# Altium footprint library con-samtec.PCBLIB: 805 footprints (part 22 of 55)
Each footprint in its own frame and in the unit in brackets; x right, y up, seen from the top. Pads: shape width x height; smd on the part's side, far side on the other; paste and mask are expansions set on the pad; w line width, h text height; cw(c..) or ccw(c..) is an arc to the next point about the centre after c.
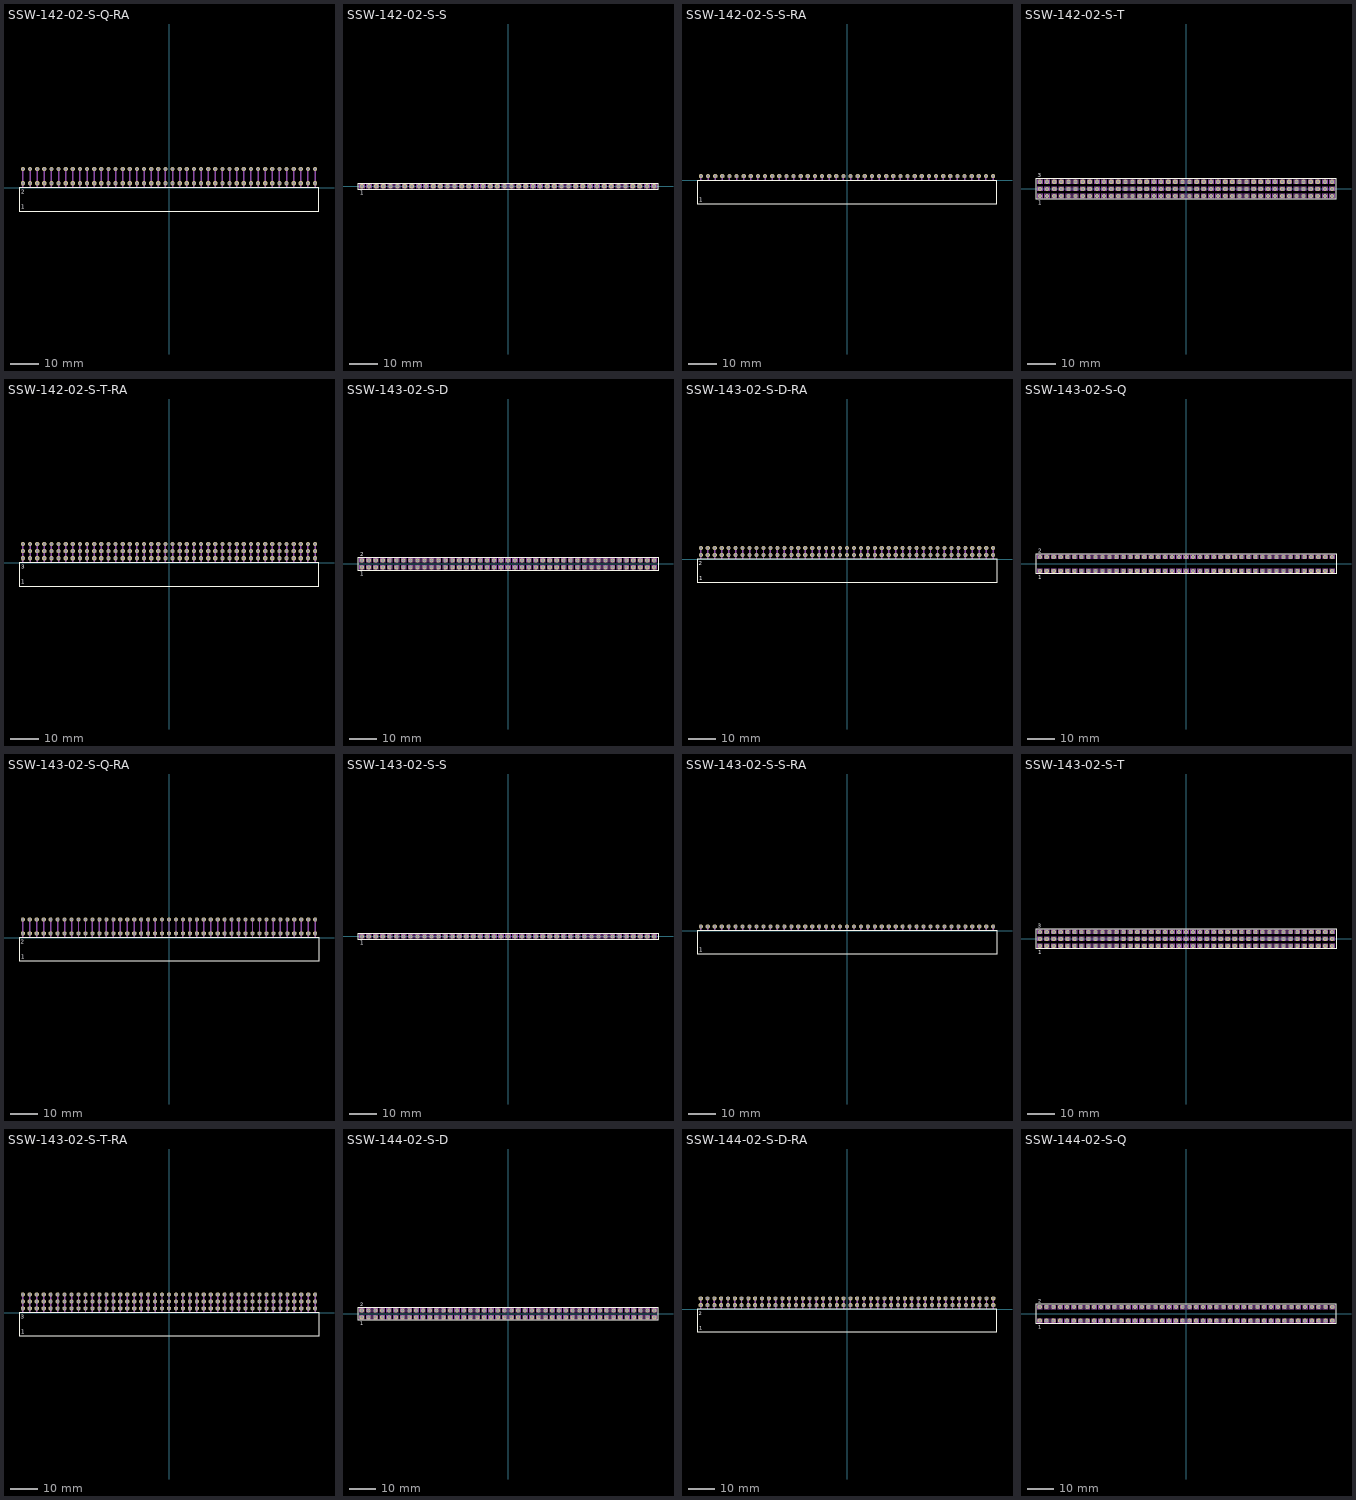
[diagram p21: the footprints below, top view; thin cyan lines are the x and y axes]

## SSW-142-02-S-Q-RA [mil]
pads (84):
  oct 59.06x59.06 hole 39.37: 1(-2050,60) 2(-2050,260) 3(-1950,60) 4(-1950,260) 5(-1850,60) 6(-1850,260) 7(-1750,60) 8(-1750,260) 9(-1650,60) 10(-1650,260) 11(-1550,60) 12(-1550,260) 13(-1450,60) 14(-1450,260) 15(-1350,60) 16(-1350,260) 17(-1250,60) 18(-1250,260) 19(-1150,60) 20(-1150,260) 21(-1050,60) 22(-1050,260) 23(-950,60) 24(-950,260) 25(-850,60) 26(-850,260) 27(-750,60) 28(-750,260) 29(-650,60) 30(-650,260) 31(-550,60) 32(-550,260) 33(-450,60) 34(-450,260) 35(-350,60) 36(-350,260) 37(-250,60) 38(-250,260) 39(-150,60) 40(-150,260) 41(-50,60) 42(-50,260) 43(50,60) 44(50,260) 45(150,60) 46(150,260) 47(250,60) 48(250,260) 49(350,60) 50(350,260) 51(450,60) 52(450,260) 53(550,60) 54(550,260) 55(650,60) 56(650,260) 57(750,60) 58(750,260) 59(850,60) 60(850,260) 61(950,60) 62(950,260) 63(1050,60) 64(1050,260) 65(1150,60) 66(1150,260) 67(1250,60) 68(1250,260) 69(1350,60) 70(1350,260) 71(1450,60) 72(1450,260) 73(1550,60) 74(1550,260) 75(1650,60) 76(1650,260) 77(1750,60) 78(1750,260) 79(1850,60) 80(1850,260) 81(1950,60) 82(1950,260) 83(2050,60) 84(2050,260)
Top Overlay:
  lines w8: -2105.08,-330.55 2105.08,-330.55 2105.08,-4.17 -2105.08,-4.17 -2105.08,-330.55
  text "1" at -2073.43,-301.18 h56.1
  text "2" at -2076.38,-86.61 h56.1
Mechanical 16:
  rectangle: -2060,0 -2040,270
  rectangle: -1960,0 -1940,270
  rectangle: -1860,0 -1840,270
  rectangle: -1760,0 -1740,270
  rectangle: -1660,0 -1640,270
  rectangle: -1560,0 -1540,270
  rectangle: -1460,0 -1440,270
  rectangle: -1360,0 -1340,270
  rectangle: -1260,0 -1240,270
  rectangle: -1160,0 -1140,270
  rectangle: -1060,0 -1040,270
  rectangle: -960,0 -940,270
  rectangle: -860,0 -840,270
  rectangle: -760,0 -740,270
  rectangle: -660,0 -640,270
  rectangle: -560,0 -540,270
  rectangle: -460,0 -440,270
  rectangle: -360,0 -340,270
  rectangle: -260,0 -240,270
  rectangle: -160,0 -140,270
  rectangle: -60,0 -40,270
  rectangle: 40,0 60,270
  rectangle: 140,0 160,270
  rectangle: 240,0 260,270
  rectangle: 340,0 360,270
  rectangle: 440,0 460,270
  rectangle: 540,0 560,270
  rectangle: 640,0 660,270
  rectangle: 740,0 760,270
  rectangle: 840,0 860,270
  rectangle: 940,0 960,270
  rectangle: 1040,0 1060,270
  rectangle: 1140,0 1160,270
  rectangle: 1240,0 1260,270
  rectangle: 1340,0 1360,270
  rectangle: 1440,0 1460,270
  rectangle: 1540,0 1560,270
  rectangle: 1640,0 1660,270
  rectangle: 1740,0 1760,270
  rectangle: 1840,0 1860,270
  rectangle: 1940,0 1960,270
  rectangle: 2040,0 2060,270

## SSW-142-02-S-S [mm]
pads (42):
  oct 1.5x1.5 hole 1: 1(-52.07,0) 2(-49.53,0) 3(-46.99,0) 4(-44.45,0) 5(-41.91,0) 6(-39.37,0) 7(-36.83,0) 8(-34.29,0) 9(-31.75,0) 10(-29.21,0) 11(-26.67,0) 12(-24.13,0) 13(-21.59,0) 14(-19.05,0) 15(-16.51,0) 16(-13.97,0) 17(-11.43,0) 18(-8.89,0) 19(-6.35,0) 20(-3.81,0) 21(-1.27,0) 22(1.27,0) 23(3.81,0) 24(6.35,0) 25(8.89,0) 26(11.43,0) 27(13.97,0) 28(16.51,0) 29(19.05,0) 30(21.59,0) 31(24.13,0) 32(26.67,0) 33(29.21,0) 34(31.75,0) 35(34.29,0) 36(36.83,0) 37(39.37,0) 38(41.91,0) 39(44.45,0) 40(46.99,0) 41(49.53,0) 42(52.07,0)
Top Overlay:
  lines w0.203: -53.469,-1.155 53.469,-1.155 53.469,1.155 -53.469,1.155 -53.469,-1.155
  text "1" at -52.578,-3.048 h1.42
Mechanical 16:
  drawing of 168 lines, arcs and shapes, not listed

## SSW-142-02-S-S-RA [mil]
pads (42):
  oct 59.06x59.06 hole 39.37: 1(-2050,60) 2(-1950,60) 3(-1850,60) 4(-1750,60) 5(-1650,60) 6(-1550,60) 7(-1450,60) 8(-1350,60) 9(-1250,60) 10(-1150,60) 11(-1050,60) 12(-950,60) 13(-850,60) 14(-750,60) 15(-650,60) 16(-550,60) 17(-450,60) 18(-350,60) 19(-250,60) 20(-150,60) 21(-50,60) 22(50,60) 23(150,60) 24(250,60) 25(350,60) 26(450,60) 27(550,60) 28(650,60) 29(750,60) 30(850,60) 31(950,60) 32(1050,60) 33(1150,60) 34(1250,60) 35(1350,60) 36(1450,60) 37(1550,60) 38(1650,60) 39(1750,60) 40(1850,60) 41(1950,60) 42(2050,60)
Top Overlay:
  lines w8: -2105.08,-330.55 2105.08,-330.55 2105.08,-4.17 -2105.08,-4.17 -2105.08,-330.55
  text "1" at -2073.43,-301.18 h56.1
Mechanical 16:
  rectangle: -2060,0 -2040,70
  rectangle: -1960,0 -1940,70
  rectangle: -1860,0 -1840,70
  rectangle: -1760,0 -1740,70
  rectangle: -1660,0 -1640,70
  rectangle: -1560,0 -1540,70
  rectangle: -1460,0 -1440,70
  rectangle: -1360,0 -1340,70
  rectangle: -1260,0 -1240,70
  rectangle: -1160,0 -1140,70
  rectangle: -1060,0 -1040,70
  rectangle: -960,0 -940,70
  rectangle: -860,0 -840,70
  rectangle: -760,0 -740,70
  rectangle: -660,0 -640,70
  rectangle: -560,0 -540,70
  rectangle: -460,0 -440,70
  rectangle: -360,0 -340,70
  rectangle: -260,0 -240,70
  rectangle: -160,0 -140,70
  rectangle: -60,0 -40,70
  rectangle: 40,0 60,70
  rectangle: 140,0 160,70
  rectangle: 240,0 260,70
  rectangle: 340,0 360,70
  rectangle: 440,0 460,70
  rectangle: 540,0 560,70
  rectangle: 640,0 660,70
  rectangle: 740,0 760,70
  rectangle: 840,0 860,70
  rectangle: 940,0 960,70
  rectangle: 1040,0 1060,70
  rectangle: 1140,0 1160,70
  rectangle: 1240,0 1260,70
  rectangle: 1340,0 1360,70
  rectangle: 1440,0 1460,70
  rectangle: 1540,0 1560,70
  rectangle: 1640,0 1660,70
  rectangle: 1740,0 1760,70
  rectangle: 1840,0 1860,70
  rectangle: 1940,0 1960,70
  rectangle: 2040,0 2060,70

## SSW-142-02-S-T [mm]
pads (126):
  oct 1.5x1.5 hole 1: 1(-52.07,-2.54) 2(-52.07,0) 3(-52.07,2.54) 4(-49.53,-2.54) 5(-49.53,0) 6(-49.53,2.54) 7(-46.99,-2.54) 8(-46.99,0) 9(-46.99,2.54) 10(-44.45,-2.54) 11(-44.45,0) 12(-44.45,2.54) 13(-41.91,-2.54) 14(-41.91,0) 15(-41.91,2.54) 16(-39.37,-2.54) 17(-39.37,0) 18(-39.37,2.54) 19(-36.83,-2.54) 20(-36.83,0) 21(-36.83,2.54) 22(-34.29,-2.54) 23(-34.29,0) 24(-34.29,2.54) 25(-31.75,-2.54) 26(-31.75,0) 27(-31.75,2.54) 28(-29.21,-2.54) 29(-29.21,0) 30(-29.21,2.54) 31(-26.67,-2.54) 32(-26.67,0) 33(-26.67,2.54) 34(-24.13,-2.54) 35(-24.13,0) 36(-24.13,2.54) 37(-21.59,-2.54) 38(-21.59,0) 39(-21.59,2.54) 40(-19.05,-2.54) 41(-19.05,0) 42(-19.05,2.54) 43(-16.51,-2.54) 44(-16.51,0) 45(-16.51,2.54) 46(-13.97,-2.54) 47(-13.97,0) 48(-13.97,2.54) 49(-11.43,-2.54) 50(-11.43,0) 51(-11.43,2.54) 52(-8.89,-2.54) 53(-8.89,0) 54(-8.89,2.54) 55(-6.35,-2.54) 56(-6.35,0) 57(-6.35,2.54) 58(-3.81,-2.54) 59(-3.81,0) 60(-3.81,2.54) 61(-1.27,-2.54) 62(-1.27,0) 63(-1.27,2.54) 64(1.27,-2.54) 65(1.27,0) 66(1.27,2.54) 67(3.81,-2.54) 68(3.81,0) 69(3.81,2.54) 70(6.35,-2.54) 71(6.35,0) 72(6.35,2.54) 73(8.89,-2.54) 74(8.89,0) 75(8.89,2.54) 76(11.43,-2.54) 77(11.43,0) 78(11.43,2.54) 79(13.97,-2.54) 80(13.97,0) 81(13.97,2.54) 82(16.51,-2.54) 83(16.51,0) 84(16.51,2.54) 85(19.05,-2.54) 86(19.05,0) 87(19.05,2.54) 88(21.59,-2.54) 89(21.59,0) 90(21.59,2.54) 91(24.13,-2.54) 92(24.13,0) 93(24.13,2.54) 94(26.67,-2.54) 95(26.67,0) 96(26.67,2.54) 97(29.21,-2.54) 98(29.21,0) 99(29.21,2.54) 100(31.75,-2.54) 101(31.75,0) 102(31.75,2.54) 103(34.29,-2.54) 104(34.29,0) 105(34.29,2.54) 106(36.83,-2.54) 107(36.83,0) 108(36.83,2.54) 109(39.37,-2.54) 110(39.37,0) 111(39.37,2.54) 112(41.91,-2.54) 113(41.91,0) 114(41.91,2.54) 115(44.45,-2.54) 116(44.45,0) 117(44.45,2.54) 118(46.99,-2.54) 119(46.99,0) 120(46.99,2.54) 121(49.53,-2.54) 122(49.53,0) 123(49.53,2.54) 124(52.07,-2.54) 125(52.07,0) 126(52.07,2.54)
Top Overlay:
  lines w0.203: -53.469,-3.695 53.469,-3.695 53.469,3.695 -53.469,3.695 -53.469,-3.695
  text "1" at -52.578,-5.588 h1.42
  text "3" at -52.832,4.064 h1.42
Mechanical 16:
  drawing of 504 lines, arcs and shapes, not listed

## SSW-142-02-S-T-RA [mil]
pads (126):
  oct 59.06x59.06 hole 39.37: 1(-2050,60) 2(-2050,160) 3(-2050,260) 4(-1950,60) 5(-1950,160) 6(-1950,260) 7(-1850,60) 8(-1850,160) 9(-1850,260) 10(-1750,60) 11(-1750,160) 12(-1750,260) 13(-1650,60) 14(-1650,160) 15(-1650,260) 16(-1550,60) 17(-1550,160) 18(-1550,260) 19(-1450,60) 20(-1450,160) 21(-1450,260) 22(-1350,60) 23(-1350,160) 24(-1350,260) 25(-1250,60) 26(-1250,160) 27(-1250,260) 28(-1150,60) 29(-1150,160) 30(-1150,260) 31(-1050,60) 32(-1050,160) 33(-1050,260) 34(-950,60) 35(-950,160) 36(-950,260) 37(-850,60) 38(-850,160) 39(-850,260) 40(-750,60) 41(-750,160) 42(-750,260) 43(-650,60) 44(-650,160) 45(-650,260) 46(-550,60) 47(-550,160) 48(-550,260) 49(-450,60) 50(-450,160) 51(-450,260) 52(-350,60) 53(-350,160) 54(-350,260) 55(-250,60) 56(-250,160) 57(-250,260) 58(-150,60) 59(-150,160) 60(-150,260) 61(-50,60) 62(-50,160) 63(-50,260) 64(50,60) 65(50,160) 66(50,260) 67(150,60) 68(150,160) 69(150,260) 70(250,60) 71(250,160) 72(250,260) 73(350,60) 74(350,160) 75(350,260) 76(450,60) 77(450,160) 78(450,260) 79(550,60) 80(550,160) 81(550,260) 82(650,60) 83(650,160) 84(650,260) 85(750,60) 86(750,160) 87(750,260) 88(850,60) 89(850,160) 90(850,260) 91(950,60) 92(950,160) 93(950,260) 94(1050,60) 95(1050,160) 96(1050,260) 97(1150,60) 98(1150,160) 99(1150,260) 100(1250,60) 101(1250,160) 102(1250,260) 103(1350,60) 104(1350,160) 105(1350,260) 106(1450,60) 107(1450,160) 108(1450,260) 109(1550,60) 110(1550,160) 111(1550,260) 112(1650,60) 113(1650,160) 114(1650,260) 115(1750,60) 116(1750,160) 117(1750,260) 118(1850,60) 119(1850,160) 120(1850,260) 121(1950,60) 122(1950,160) 123(1950,260) 124(2050,60) 125(2050,160) 126(2050,260)
Top Overlay:
  lines w8: -2105.08,-330.55 2105.08,-330.55 2105.08,-4.17 -2105.08,-4.17 -2105.08,-330.55
  text "1" at -2073.43,-301.18 h56.1
  text "3" at -2076.38,-86.61 h56.1
Mechanical 16:
  rectangle: -2060,0 -2040,270
  rectangle: -1960,0 -1940,270
  rectangle: -1860,0 -1840,270
  rectangle: -1760,0 -1740,270
  rectangle: -1660,0 -1640,270
  rectangle: -1560,0 -1540,270
  rectangle: -1460,0 -1440,270
  rectangle: -1360,0 -1340,270
  rectangle: -1260,0 -1240,270
  rectangle: -1160,0 -1140,270
  rectangle: -1060,0 -1040,270
  rectangle: -960,0 -940,270
  rectangle: -860,0 -840,270
  rectangle: -760,0 -740,270
  rectangle: -660,0 -640,270
  rectangle: -560,0 -540,270
  rectangle: -460,0 -440,270
  rectangle: -360,0 -340,270
  rectangle: -260,0 -240,270
  rectangle: -160,0 -140,270
  rectangle: -60,0 -40,270
  rectangle: 40,0 60,270
  rectangle: 140,0 160,270
  rectangle: 240,0 260,270
  rectangle: 340,0 360,270
  rectangle: 440,0 460,270
  rectangle: 540,0 560,270
  rectangle: 640,0 660,270
  rectangle: 740,0 760,270
  rectangle: 840,0 860,270
  rectangle: 940,0 960,270
  rectangle: 1040,0 1060,270
  rectangle: 1140,0 1160,270
  rectangle: 1240,0 1260,270
  rectangle: 1340,0 1360,270
  rectangle: 1440,0 1460,270
  rectangle: 1540,0 1560,270
  rectangle: 1640,0 1660,270
  rectangle: 1740,0 1760,270
  rectangle: 1840,0 1860,270
  rectangle: 1940,0 1960,270
  rectangle: 2040,0 2060,270

## SSW-143-02-S-D [mm]
pads (86):
  oct 1.5x1.5 hole 1: 1(-53.34,-1.27) 2(-53.34,1.27) 3(-50.8,-1.27) 4(-50.8,1.27) 5(-48.26,-1.27) 6(-48.26,1.27) 7(-45.72,-1.27) 8(-45.72,1.27) 9(-43.18,-1.27) 10(-43.18,1.27) 11(-40.64,-1.27) 12(-40.64,1.27) 13(-38.1,-1.27) 14(-38.1,1.27) 15(-35.56,-1.27) 16(-35.56,1.27) 17(-33.02,-1.27) 18(-33.02,1.27) 19(-30.48,-1.27) 20(-30.48,1.27) 21(-27.94,-1.27) 22(-27.94,1.27) 23(-25.4,-1.27) 24(-25.4,1.27) 25(-22.86,-1.27) 26(-22.86,1.27) 27(-20.32,-1.27) 28(-20.32,1.27) 29(-17.78,-1.27) 30(-17.78,1.27) 31(-15.24,-1.27) 32(-15.24,1.27) 33(-12.7,-1.27) 34(-12.7,1.27) 35(-10.16,-1.27) 36(-10.16,1.27) 37(-7.62,-1.27) 38(-7.62,1.27) 39(-5.08,-1.27) 40(-5.08,1.27) 41(-2.54,-1.27) 42(-2.54,1.27) 43(0,-1.27) 44(0,1.27) 45(2.54,-1.27) 46(2.54,1.27) 47(5.08,-1.27) 48(5.08,1.27) 49(7.62,-1.27) 50(7.62,1.27) 51(10.16,-1.27) 52(10.16,1.27) 53(12.7,-1.27) 54(12.7,1.27) 55(15.24,-1.27) 56(15.24,1.27) 57(17.78,-1.27) 58(17.78,1.27) 59(20.32,-1.27) 60(20.32,1.27) 61(22.86,-1.27) 62(22.86,1.27) 63(25.4,-1.27) 64(25.4,1.27) 65(27.94,-1.27) 66(27.94,1.27) 67(30.48,-1.27) 68(30.48,1.27) 69(33.02,-1.27) 70(33.02,1.27) 71(35.56,-1.27) 72(35.56,1.27) 73(38.1,-1.27) 74(38.1,1.27) 75(40.64,-1.27) 76(40.64,1.27) 77(43.18,-1.27) 78(43.18,1.27) 79(45.72,-1.27) 80(45.72,1.27) 81(48.26,-1.27) 82(48.26,1.27) 83(50.8,-1.27) 84(50.8,1.27) 85(53.34,-1.27) 86(53.34,1.27)
Top Overlay:
  lines w0.203: -54.739,-2.425 54.739,-2.425 54.739,2.425 -54.739,2.425 -54.739,-2.425
  text "1" at -53.848,-4.318 h1.42
  text "2" at -53.848,2.794 h1.42
Mechanical 16:
  drawing of 344 lines, arcs and shapes, not listed

## SSW-143-02-S-D-RA [mil]
pads (86):
  oct 59.06x59.06 hole 39.37: 1(-2100,60) 2(-2100,160) 3(-2000,60) 4(-2000,160) 5(-1900,60) 6(-1900,160) 7(-1800,60) 8(-1800,160) 9(-1700,60) 10(-1700,160) 11(-1600,60) 12(-1600,160) 13(-1500,60) 14(-1500,160) 15(-1400,60) 16(-1400,160) 17(-1300,60) 18(-1300,160) 19(-1200,60) 20(-1200,160) 21(-1100,60) 22(-1100,160) 23(-1000,60) 24(-1000,160) 25(-900,60) 26(-900,160) 27(-800,60) 28(-800,160) 29(-700,60) 30(-700,160) 31(-600,60) 32(-600,160) 33(-500,60) 34(-500,160) 35(-400,60) 36(-400,160) 37(-300,60) 38(-300,160) 39(-200,60) 40(-200,160) 41(-100,60) 42(-100,160) 43(0,60) 44(0,160) 45(100,60) 46(100,160) 47(200,60) 48(200,160) 49(300,60) 50(300,160) 51(400,60) 52(400,160) 53(500,60) 54(500,160) 55(600,60) 56(600,160) 57(700,60) 58(700,160) 59(800,60) 60(800,160) 61(900,60) 62(900,160) 63(1000,60) 64(1000,160) 65(1100,60) 66(1100,160) 67(1200,60) 68(1200,160) 69(1300,60) 70(1300,160) 71(1400,60) 72(1400,160) 73(1500,60) 74(1500,160) 75(1600,60) 76(1600,160) 77(1700,60) 78(1700,160) 79(1800,60) 80(1800,160) 81(1900,60) 82(1900,160) 83(2000,60) 84(2000,160) 85(2100,60) 86(2100,160)
Top Overlay:
  lines w8: -2155.08,-330.55 2155.08,-330.55 2155.08,-4.17 -2155.08,-4.17 -2155.08,-330.55
  text "1" at -2123.43,-301.18 h56.1
  text "2" at -2126.38,-86.61 h56.1
Mechanical 16:
  rectangle: -2110,0 -2090,170
  rectangle: -2010,0 -1990,170
  rectangle: -1910,0 -1890,170
  rectangle: -1810,0 -1790,170
  rectangle: -1710,0 -1690,170
  rectangle: -1610,0 -1590,170
  rectangle: -1510,0 -1490,170
  rectangle: -1410,0 -1390,170
  rectangle: -1310,0 -1290,170
  rectangle: -1210,0 -1190,170
  rectangle: -1110,0 -1090,170
  rectangle: -1010,0 -990,170
  rectangle: -910,0 -890,170
  rectangle: -810,0 -790,170
  rectangle: -710,0 -690,170
  rectangle: -610,0 -590,170
  rectangle: -510,0 -490,170
  rectangle: -410,0 -390,170
  rectangle: -310,0 -290,170
  rectangle: -210,0 -190,170
  rectangle: -110,0 -90,170
  rectangle: -10,0 10,170
  rectangle: 90,0 110,170
  rectangle: 190,0 210,170
  rectangle: 290,0 310,170
  rectangle: 390,0 410,170
  rectangle: 490,0 510,170
  rectangle: 590,0 610,170
  rectangle: 690,0 710,170
  rectangle: 790,0 810,170
  rectangle: 890,0 910,170
  rectangle: 990,0 1010,170
  rectangle: 1090,0 1110,170
  rectangle: 1190,0 1210,170
  rectangle: 1290,0 1310,170
  rectangle: 1390,0 1410,170
  rectangle: 1490,0 1510,170
  rectangle: 1590,0 1610,170
  rectangle: 1690,0 1710,170
  rectangle: 1790,0 1810,170
  rectangle: 1890,0 1910,170
  rectangle: 1990,0 2010,170
  rectangle: 2090,0 2110,170

## SSW-143-02-S-Q [mm]
pads (86):
  oct 1.5x1.5 hole 1: 1(-53.34,-2.54) 2(-53.34,2.54) 3(-50.8,-2.54) 4(-50.8,2.54) 5(-48.26,-2.54) 6(-48.26,2.54) 7(-45.72,-2.54) 8(-45.72,2.54) 9(-43.18,-2.54) 10(-43.18,2.54) 11(-40.64,-2.54) 12(-40.64,2.54) 13(-38.1,-2.54) 14(-38.1,2.54) 15(-35.56,-2.54) 16(-35.56,2.54) 17(-33.02,-2.54) 18(-33.02,2.54) 19(-30.48,-2.54) 20(-30.48,2.54) 21(-27.94,-2.54) 22(-27.94,2.54) 23(-25.4,-2.54) 24(-25.4,2.54) 25(-22.86,-2.54) 26(-22.86,2.54) 27(-20.32,-2.54) 28(-20.32,2.54) 29(-17.78,-2.54) 30(-17.78,2.54) 31(-15.24,-2.54) 32(-15.24,2.54) 33(-12.7,-2.54) 34(-12.7,2.54) 35(-10.16,-2.54) 36(-10.16,2.54) 37(-7.62,-2.54) 38(-7.62,2.54) 39(-5.08,-2.54) 40(-5.08,2.54) 41(-2.54,-2.54) 42(-2.54,2.54) 43(0,-2.54) 44(0,2.54) 45(2.54,-2.54) 46(2.54,2.54) 47(5.08,-2.54) 48(5.08,2.54) 49(7.62,-2.54) 50(7.62,2.54) 51(10.16,-2.54) 52(10.16,2.54) 53(12.7,-2.54) 54(12.7,2.54) 55(15.24,-2.54) 56(15.24,2.54) 57(17.78,-2.54) 58(17.78,2.54) 59(20.32,-2.54) 60(20.32,2.54) 61(22.86,-2.54) 62(22.86,2.54) 63(25.4,-2.54) 64(25.4,2.54) 65(27.94,-2.54) 66(27.94,2.54) 67(30.48,-2.54) 68(30.48,2.54) 69(33.02,-2.54) 70(33.02,2.54) 71(35.56,-2.54) 72(35.56,2.54) 73(38.1,-2.54) 74(38.1,2.54) 75(40.64,-2.54) 76(40.64,2.54) 77(43.18,-2.54) 78(43.18,2.54) 79(45.72,-2.54) 80(45.72,2.54) 81(48.26,-2.54) 82(48.26,2.54) 83(50.8,-2.54) 84(50.8,2.54) 85(53.34,-2.54) 86(53.34,2.54)
Top Overlay:
  lines w0.203: -54.739,-3.695 54.739,-3.695 54.739,3.695 -54.739,3.695 -54.739,-3.695
  text "1" at -53.848,-5.588 h1.42
  text "2" at -53.848,4.064 h1.42
Mechanical 16:
  drawing of 344 lines, arcs and shapes, not listed

## SSW-143-02-S-Q-RA [mil]
pads (86):
  oct 59.06x59.06 hole 39.37: 1(-2100,60) 2(-2100,260) 3(-2000,60) 4(-2000,260) 5(-1900,60) 6(-1900,260) 7(-1800,60) 8(-1800,260) 9(-1700,60) 10(-1700,260) 11(-1600,60) 12(-1600,260) 13(-1500,60) 14(-1500,260) 15(-1400,60) 16(-1400,260) 17(-1300,60) 18(-1300,260) 19(-1200,60) 20(-1200,260) 21(-1100,60) 22(-1100,260) 23(-1000,60) 24(-1000,260) 25(-900,60) 26(-900,260) 27(-800,60) 28(-800,260) 29(-700,60) 30(-700,260) 31(-600,60) 32(-600,260) 33(-500,60) 34(-500,260) 35(-400,60) 36(-400,260) 37(-300,60) 38(-300,260) 39(-200,60) 40(-200,260) 41(-100,60) 42(-100,260) 43(0,60) 44(0,260) 45(100,60) 46(100,260) 47(200,60) 48(200,260) 49(300,60) 50(300,260) 51(400,60) 52(400,260) 53(500,60) 54(500,260) 55(600,60) 56(600,260) 57(700,60) 58(700,260) 59(800,60) 60(800,260) 61(900,60) 62(900,260) 63(1000,60) 64(1000,260) 65(1100,60) 66(1100,260) 67(1200,60) 68(1200,260) 69(1300,60) 70(1300,260) 71(1400,60) 72(1400,260) 73(1500,60) 74(1500,260) 75(1600,60) 76(1600,260) 77(1700,60) 78(1700,260) 79(1800,60) 80(1800,260) 81(1900,60) 82(1900,260) 83(2000,60) 84(2000,260) 85(2100,60) 86(2100,260)
Top Overlay:
  lines w8: -2155.08,-330.55 2155.08,-330.55 2155.08,-4.17 -2155.08,-4.17 -2155.08,-330.55
  text "1" at -2123.43,-301.18 h56.1
  text "2" at -2126.38,-86.61 h56.1
Mechanical 16:
  rectangle: -2110,0 -2090,270
  rectangle: -2010,0 -1990,270
  rectangle: -1910,0 -1890,270
  rectangle: -1810,0 -1790,270
  rectangle: -1710,0 -1690,270
  rectangle: -1610,0 -1590,270
  rectangle: -1510,0 -1490,270
  rectangle: -1410,0 -1390,270
  rectangle: -1310,0 -1290,270
  rectangle: -1210,0 -1190,270
  rectangle: -1110,0 -1090,270
  rectangle: -1010,0 -990,270
  rectangle: -910,0 -890,270
  rectangle: -810,0 -790,270
  rectangle: -710,0 -690,270
  rectangle: -610,0 -590,270
  rectangle: -510,0 -490,270
  rectangle: -410,0 -390,270
  rectangle: -310,0 -290,270
  rectangle: -210,0 -190,270
  rectangle: -110,0 -90,270
  rectangle: -10,0 10,270
  rectangle: 90,0 110,270
  rectangle: 190,0 210,270
  rectangle: 290,0 310,270
  rectangle: 390,0 410,270
  rectangle: 490,0 510,270
  rectangle: 590,0 610,270
  rectangle: 690,0 710,270
  rectangle: 790,0 810,270
  rectangle: 890,0 910,270
  rectangle: 990,0 1010,270
  rectangle: 1090,0 1110,270
  rectangle: 1190,0 1210,270
  rectangle: 1290,0 1310,270
  rectangle: 1390,0 1410,270
  rectangle: 1490,0 1510,270
  rectangle: 1590,0 1610,270
  rectangle: 1690,0 1710,270
  rectangle: 1790,0 1810,270
  rectangle: 1890,0 1910,270
  rectangle: 1990,0 2010,270
  rectangle: 2090,0 2110,270

## SSW-143-02-S-S [mm]
pads (43):
  oct 1.5x1.5 hole 1: 1(-53.34,0) 2(-50.8,0) 3(-48.26,0) 4(-45.72,0) 5(-43.18,0) 6(-40.64,0) 7(-38.1,0) 8(-35.56,0) 9(-33.02,0) 10(-30.48,0) 11(-27.94,0) 12(-25.4,0) 13(-22.86,0) 14(-20.32,0) 15(-17.78,0) 16(-15.24,0) 17(-12.7,0) 18(-10.16,0) 19(-7.62,0) 20(-5.08,0) 21(-2.54,0) 22(0,0) 23(2.54,0) 24(5.08,0) 25(7.62,0) 26(10.16,0) 27(12.7,0) 28(15.24,0) 29(17.78,0) 30(20.32,0) 31(22.86,0) 32(25.4,0) 33(27.94,0) 34(30.48,0) 35(33.02,0) 36(35.56,0) 37(38.1,0) 38(40.64,0) 39(43.18,0) 40(45.72,0) 41(48.26,0) 42(50.8,0) 43(53.34,0)
Top Overlay:
  lines w0.203: -54.739,-1.155 54.739,-1.155 54.739,1.155 -54.739,1.155 -54.739,-1.155
  text "1" at -53.848,-3.048 h1.42
Mechanical 16:
  drawing of 172 lines, arcs and shapes, not listed

## SSW-143-02-S-S-RA [mil]
pads (43):
  oct 59.06x59.06 hole 39.37: 1(-2100,60) 2(-2000,60) 3(-1900,60) 4(-1800,60) 5(-1700,60) 6(-1600,60) 7(-1500,60) 8(-1400,60) 9(-1300,60) 10(-1200,60) 11(-1100,60) 12(-1000,60) 13(-900,60) 14(-800,60) 15(-700,60) 16(-600,60) 17(-500,60) 18(-400,60) 19(-300,60) 20(-200,60) 21(-100,60) 22(0,60) 23(100,60) 24(200,60) 25(300,60) 26(400,60) 27(500,60) 28(600,60) 29(700,60) 30(800,60) 31(900,60) 32(1000,60) 33(1100,60) 34(1200,60) 35(1300,60) 36(1400,60) 37(1500,60) 38(1600,60) 39(1700,60) 40(1800,60) 41(1900,60) 42(2000,60) 43(2100,60)
Top Overlay:
  lines w8: -2155.08,-330.55 2155.08,-330.55 2155.08,-4.17 -2155.08,-4.17 -2155.08,-330.55
  text "1" at -2123.43,-301.18 h56.1
Mechanical 16:
  rectangle: -2110,0 -2090,70
  rectangle: -2010,0 -1990,70
  rectangle: -1910,0 -1890,70
  rectangle: -1810,0 -1790,70
  rectangle: -1710,0 -1690,70
  rectangle: -1610,0 -1590,70
  rectangle: -1510,0 -1490,70
  rectangle: -1410,0 -1390,70
  rectangle: -1310,0 -1290,70
  rectangle: -1210,0 -1190,70
  rectangle: -1110,0 -1090,70
  rectangle: -1010,0 -990,70
  rectangle: -910,0 -890,70
  rectangle: -810,0 -790,70
  rectangle: -710,0 -690,70
  rectangle: -610,0 -590,70
  rectangle: -510,0 -490,70
  rectangle: -410,0 -390,70
  rectangle: -310,0 -290,70
  rectangle: -210,0 -190,70
  rectangle: -110,0 -90,70
  rectangle: -10,0 10,70
  rectangle: 90,0 110,70
  rectangle: 190,0 210,70
  rectangle: 290,0 310,70
  rectangle: 390,0 410,70
  rectangle: 490,0 510,70
  rectangle: 590,0 610,70
  rectangle: 690,0 710,70
  rectangle: 790,0 810,70
  rectangle: 890,0 910,70
  rectangle: 990,0 1010,70
  rectangle: 1090,0 1110,70
  rectangle: 1190,0 1210,70
  rectangle: 1290,0 1310,70
  rectangle: 1390,0 1410,70
  rectangle: 1490,0 1510,70
  rectangle: 1590,0 1610,70
  rectangle: 1690,0 1710,70
  rectangle: 1790,0 1810,70
  rectangle: 1890,0 1910,70
  rectangle: 1990,0 2010,70
  rectangle: 2090,0 2110,70

## SSW-143-02-S-T [mm]
pads (129):
  oct 1.5x1.5 hole 1: 1(-53.34,-2.54) 2(-53.34,0) 3(-53.34,2.54) 4(-50.8,-2.54) 5(-50.8,0) 6(-50.8,2.54) 7(-48.26,-2.54) 8(-48.26,0) 9(-48.26,2.54) 10(-45.72,-2.54) 11(-45.72,0) 12(-45.72,2.54) 13(-43.18,-2.54) 14(-43.18,0) 15(-43.18,2.54) 16(-40.64,-2.54) 17(-40.64,0) 18(-40.64,2.54) 19(-38.1,-2.54) 20(-38.1,0) 21(-38.1,2.54) 22(-35.56,-2.54) 23(-35.56,0) 24(-35.56,2.54) 25(-33.02,-2.54) 26(-33.02,0) 27(-33.02,2.54) 28(-30.48,-2.54) 29(-30.48,0) 30(-30.48,2.54) 31(-27.94,-2.54) 32(-27.94,0) 33(-27.94,2.54) 34(-25.4,-2.54) 35(-25.4,0) 36(-25.4,2.54) 37(-22.86,-2.54) 38(-22.86,0) 39(-22.86,2.54) 40(-20.32,-2.54) 41(-20.32,0) 42(-20.32,2.54) 43(-17.78,-2.54) 44(-17.78,0) 45(-17.78,2.54) 46(-15.24,-2.54) 47(-15.24,0) 48(-15.24,2.54) 49(-12.7,-2.54) 50(-12.7,0) 51(-12.7,2.54) 52(-10.16,-2.54) 53(-10.16,0) 54(-10.16,2.54) 55(-7.62,-2.54) 56(-7.62,0) 57(-7.62,2.54) 58(-5.08,-2.54) 59(-5.08,0) 60(-5.08,2.54) 61(-2.54,-2.54) 62(-2.54,0) 63(-2.54,2.54) 64(0,-2.54) 65(0,0) 66(0,2.54) 67(2.54,-2.54) 68(2.54,0) 69(2.54,2.54) 70(5.08,-2.54) 71(5.08,0) 72(5.08,2.54) 73(7.62,-2.54) 74(7.62,0) 75(7.62,2.54) 76(10.16,-2.54) 77(10.16,0) 78(10.16,2.54) 79(12.7,-2.54) 80(12.7,0) 81(12.7,2.54) 82(15.24,-2.54) 83(15.24,0) 84(15.24,2.54) 85(17.78,-2.54) 86(17.78,0) 87(17.78,2.54) 88(20.32,-2.54) 89(20.32,0) 90(20.32,2.54) 91(22.86,-2.54) 92(22.86,0) 93(22.86,2.54) 94(25.4,-2.54) 95(25.4,0) 96(25.4,2.54) 97(27.94,-2.54) 98(27.94,0) 99(27.94,2.54) 100(30.48,-2.54) 101(30.48,0) 102(30.48,2.54) 103(33.02,-2.54) 104(33.02,0) 105(33.02,2.54) 106(35.56,-2.54) 107(35.56,0) 108(35.56,2.54) 109(38.1,-2.54) 110(38.1,0) 111(38.1,2.54) 112(40.64,-2.54) 113(40.64,0) 114(40.64,2.54) 115(43.18,-2.54) 116(43.18,0) 117(43.18,2.54) 118(45.72,-2.54) 119(45.72,0) 120(45.72,2.54) 121(48.26,-2.54) 122(48.26,0) 123(48.26,2.54) 124(50.8,-2.54) 125(50.8,0) 126(50.8,2.54) 127(53.34,-2.54) 128(53.34,0) 129(53.34,2.54)
Top Overlay:
  lines w0.203: -54.739,-3.695 54.739,-3.695 54.739,3.695 -54.739,3.695 -54.739,-3.695
  text "1" at -53.848,-5.588 h1.42
  text "3" at -54.102,4.064 h1.42
Mechanical 16:
  drawing of 516 lines, arcs and shapes, not listed

## SSW-143-02-S-T-RA [mil]
pads (129):
  oct 59.06x59.06 hole 39.37: 1(-2100,60) 2(-2100,160) 3(-2100,260) 4(-2000,60) 5(-2000,160) 6(-2000,260) 7(-1900,60) 8(-1900,160) 9(-1900,260) 10(-1800,60) 11(-1800,160) 12(-1800,260) 13(-1700,60) 14(-1700,160) 15(-1700,260) 16(-1600,60) 17(-1600,160) 18(-1600,260) 19(-1500,60) 20(-1500,160) 21(-1500,260) 22(-1400,60) 23(-1400,160) 24(-1400,260) 25(-1300,60) 26(-1300,160) 27(-1300,260) 28(-1200,60) 29(-1200,160) 30(-1200,260) 31(-1100,60) 32(-1100,160) 33(-1100,260) 34(-1000,60) 35(-1000,160) 36(-1000,260) 37(-900,60) 38(-900,160) 39(-900,260) 40(-800,60) 41(-800,160) 42(-800,260) 43(-700,60) 44(-700,160) 45(-700,260) 46(-600,60) 47(-600,160) 48(-600,260) 49(-500,60) 50(-500,160) 51(-500,260) 52(-400,60) 53(-400,160) 54(-400,260) 55(-300,60) 56(-300,160) 57(-300,260) 58(-200,60) 59(-200,160) 60(-200,260) 61(-100,60) 62(-100,160) 63(-100,260) 64(0,60) 65(0,160) 66(0,260) 67(100,60) 68(100,160) 69(100,260) 70(200,60) 71(200,160) 72(200,260) 73(300,60) 74(300,160) 75(300,260) 76(400,60) 77(400,160) 78(400,260) 79(500,60) 80(500,160) 81(500,260) 82(600,60) 83(600,160) 84(600,260) 85(700,60) 86(700,160) 87(700,260) 88(800,60) 89(800,160) 90(800,260) 91(900,60) 92(900,160) 93(900,260) 94(1000,60) 95(1000,160) 96(1000,260) 97(1100,60) 98(1100,160) 99(1100,260) 100(1200,60) 101(1200,160) 102(1200,260) 103(1300,60) 104(1300,160) 105(1300,260) 106(1400,60) 107(1400,160) 108(1400,260) 109(1500,60) 110(1500,160) 111(1500,260) 112(1600,60) 113(1600,160) 114(1600,260) 115(1700,60) 116(1700,160) 117(1700,260) 118(1800,60) 119(1800,160) 120(1800,260) 121(1900,60) 122(1900,160) 123(1900,260) 124(2000,60) 125(2000,160) 126(2000,260) 127(2100,60) 128(2100,160) 129(2100,260)
Top Overlay:
  lines w8: -2155.08,-330.55 2155.08,-330.55 2155.08,-4.17 -2155.08,-4.17 -2155.08,-330.55
  text "1" at -2123.43,-301.18 h56.1
  text "3" at -2126.38,-86.61 h56.1
Mechanical 16:
  rectangle: -2110,0 -2090,270
  rectangle: -2010,0 -1990,270
  rectangle: -1910,0 -1890,270
  rectangle: -1810,0 -1790,270
  rectangle: -1710,0 -1690,270
  rectangle: -1610,0 -1590,270
  rectangle: -1510,0 -1490,270
  rectangle: -1410,0 -1390,270
  rectangle: -1310,0 -1290,270
  rectangle: -1210,0 -1190,270
  rectangle: -1110,0 -1090,270
  rectangle: -1010,0 -990,270
  rectangle: -910,0 -890,270
  rectangle: -810,0 -790,270
  rectangle: -710,0 -690,270
  rectangle: -610,0 -590,270
  rectangle: -510,0 -490,270
  rectangle: -410,0 -390,270
  rectangle: -310,0 -290,270
  rectangle: -210,0 -190,270
  rectangle: -110,0 -90,270
  rectangle: -10,0 10,270
  rectangle: 90,0 110,270
  rectangle: 190,0 210,270
  rectangle: 290,0 310,270
  rectangle: 390,0 410,270
  rectangle: 490,0 510,270
  rectangle: 590,0 610,270
  rectangle: 690,0 710,270
  rectangle: 790,0 810,270
  rectangle: 890,0 910,270
  rectangle: 990,0 1010,270
  rectangle: 1090,0 1110,270
  rectangle: 1190,0 1210,270
  rectangle: 1290,0 1310,270
  rectangle: 1390,0 1410,270
  rectangle: 1490,0 1510,270
  rectangle: 1590,0 1610,270
  rectangle: 1690,0 1710,270
  rectangle: 1790,0 1810,270
  rectangle: 1890,0 1910,270
  rectangle: 1990,0 2010,270
  rectangle: 2090,0 2110,270

## SSW-144-02-S-D [mm]
pads (88):
  oct 1.5x1.5 hole 1: 1(-54.61,-1.27) 2(-54.61,1.27) 3(-52.07,-1.27) 4(-52.07,1.27) 5(-49.53,-1.27) 6(-49.53,1.27) 7(-46.99,-1.27) 8(-46.99,1.27) 9(-44.45,-1.27) 10(-44.45,1.27) 11(-41.91,-1.27) 12(-41.91,1.27) 13(-39.37,-1.27) 14(-39.37,1.27) 15(-36.83,-1.27) 16(-36.83,1.27) 17(-34.29,-1.27) 18(-34.29,1.27) 19(-31.75,-1.27) 20(-31.75,1.27) 21(-29.21,-1.27) 22(-29.21,1.27) 23(-26.67,-1.27) 24(-26.67,1.27) 25(-24.13,-1.27) 26(-24.13,1.27) 27(-21.59,-1.27) 28(-21.59,1.27) 29(-19.05,-1.27) 30(-19.05,1.27) 31(-16.51,-1.27) 32(-16.51,1.27) 33(-13.97,-1.27) 34(-13.97,1.27) 35(-11.43,-1.27) 36(-11.43,1.27) 37(-8.89,-1.27) 38(-8.89,1.27) 39(-6.35,-1.27) 40(-6.35,1.27) 41(-3.81,-1.27) 42(-3.81,1.27) 43(-1.27,-1.27) 44(-1.27,1.27) 45(1.27,-1.27) 46(1.27,1.27) 47(3.81,-1.27) 48(3.81,1.27) 49(6.35,-1.27) 50(6.35,1.27) 51(8.89,-1.27) 52(8.89,1.27) 53(11.43,-1.27) 54(11.43,1.27) 55(13.97,-1.27) 56(13.97,1.27) 57(16.51,-1.27) 58(16.51,1.27) 59(19.05,-1.27) 60(19.05,1.27) 61(21.59,-1.27) 62(21.59,1.27) 63(24.13,-1.27) 64(24.13,1.27) 65(26.67,-1.27) 66(26.67,1.27) 67(29.21,-1.27) 68(29.21,1.27) 69(31.75,-1.27) 70(31.75,1.27) 71(34.29,-1.27) 72(34.29,1.27) 73(36.83,-1.27) 74(36.83,1.27) 75(39.37,-1.27) 76(39.37,1.27) 77(41.91,-1.27) 78(41.91,1.27) 79(44.45,-1.27) 80(44.45,1.27) 81(46.99,-1.27) 82(46.99,1.27) 83(49.53,-1.27) 84(49.53,1.27) 85(52.07,-1.27) 86(52.07,1.27) 87(54.61,-1.27) 88(54.61,1.27)
Top Overlay:
  lines w0.203: -56.009,-2.425 56.009,-2.425 56.009,2.425 -56.009,2.425 -56.009,-2.425
  text "1" at -55.118,-4.318 h1.42
  text "2" at -55.118,2.794 h1.42
Mechanical 16:
  drawing of 352 lines, arcs and shapes, not listed

## SSW-144-02-S-D-RA [mil]
pads (88):
  oct 59.06x59.06 hole 39.37: 1(-2150,60) 2(-2150,160) 3(-2050,60) 4(-2050,160) 5(-1950,60) 6(-1950,160) 7(-1850,60) 8(-1850,160) 9(-1750,60) 10(-1750,160) 11(-1650,60) 12(-1650,160) 13(-1550,60) 14(-1550,160) 15(-1450,60) 16(-1450,160) 17(-1350,60) 18(-1350,160) 19(-1250,60) 20(-1250,160) 21(-1150,60) 22(-1150,160) 23(-1050,60) 24(-1050,160) 25(-950,60) 26(-950,160) 27(-850,60) 28(-850,160) 29(-750,60) 30(-750,160) 31(-650,60) 32(-650,160) 33(-550,60) 34(-550,160) 35(-450,60) 36(-450,160) 37(-350,60) 38(-350,160) 39(-250,60) 40(-250,160) 41(-150,60) 42(-150,160) 43(-50,60) 44(-50,160) 45(50,60) 46(50,160) 47(150,60) 48(150,160) 49(250,60) 50(250,160) 51(350,60) 52(350,160) 53(450,60) 54(450,160) 55(550,60) 56(550,160) 57(650,60) 58(650,160) 59(750,60) 60(750,160) 61(850,60) 62(850,160) 63(950,60) 64(950,160) 65(1050,60) 66(1050,160) 67(1150,60) 68(1150,160) 69(1250,60) 70(1250,160) 71(1350,60) 72(1350,160) 73(1450,60) 74(1450,160) 75(1550,60) 76(1550,160) 77(1650,60) 78(1650,160) 79(1750,60) 80(1750,160) 81(1850,60) 82(1850,160) 83(1950,60) 84(1950,160) 85(2050,60) 86(2050,160) 87(2150,60) 88(2150,160)
Top Overlay:
  lines w8: -2205.08,-330.55 2205.08,-330.55 2205.08,-4.17 -2205.08,-4.17 -2205.08,-330.55
  text "1" at -2173.43,-301.18 h56.1
  text "2" at -2176.38,-86.61 h56.1
Mechanical 16:
  rectangle: -2160,0 -2140,170
  rectangle: -2060,0 -2040,170
  rectangle: -1960,0 -1940,170
  rectangle: -1860,0 -1840,170
  rectangle: -1760,0 -1740,170
  rectangle: -1660,0 -1640,170
  rectangle: -1560,0 -1540,170
  rectangle: -1460,0 -1440,170
  rectangle: -1360,0 -1340,170
  rectangle: -1260,0 -1240,170
  rectangle: -1160,0 -1140,170
  rectangle: -1060,0 -1040,170
  rectangle: -960,0 -940,170
  rectangle: -860,0 -840,170
  rectangle: -760,0 -740,170
  rectangle: -660,0 -640,170
  rectangle: -560,0 -540,170
  rectangle: -460,0 -440,170
  rectangle: -360,0 -340,170
  rectangle: -260,0 -240,170
  rectangle: -160,0 -140,170
  rectangle: -60,0 -40,170
  rectangle: 40,0 60,170
  rectangle: 140,0 160,170
  rectangle: 240,0 260,170
  rectangle: 340,0 360,170
  rectangle: 440,0 460,170
  rectangle: 540,0 560,170
  rectangle: 640,0 660,170
  rectangle: 740,0 760,170
  rectangle: 840,0 860,170
  rectangle: 940,0 960,170
  rectangle: 1040,0 1060,170
  rectangle: 1140,0 1160,170
  rectangle: 1240,0 1260,170
  rectangle: 1340,0 1360,170
  rectangle: 1440,0 1460,170
  rectangle: 1540,0 1560,170
  rectangle: 1640,0 1660,170
  rectangle: 1740,0 1760,170
  rectangle: 1840,0 1860,170
  rectangle: 1940,0 1960,170
  rectangle: 2040,0 2060,170
  rectangle: 2140,0 2160,170

## SSW-144-02-S-Q [mm]
pads (88):
  oct 1.5x1.5 hole 1: 1(-54.61,-2.54) 2(-54.61,2.54) 3(-52.07,-2.54) 4(-52.07,2.54) 5(-49.53,-2.54) 6(-49.53,2.54) 7(-46.99,-2.54) 8(-46.99,2.54) 9(-44.45,-2.54) 10(-44.45,2.54) 11(-41.91,-2.54) 12(-41.91,2.54) 13(-39.37,-2.54) 14(-39.37,2.54) 15(-36.83,-2.54) 16(-36.83,2.54) 17(-34.29,-2.54) 18(-34.29,2.54) 19(-31.75,-2.54) 20(-31.75,2.54) 21(-29.21,-2.54) 22(-29.21,2.54) 23(-26.67,-2.54) 24(-26.67,2.54) 25(-24.13,-2.54) 26(-24.13,2.54) 27(-21.59,-2.54) 28(-21.59,2.54) 29(-19.05,-2.54) 30(-19.05,2.54) 31(-16.51,-2.54) 32(-16.51,2.54) 33(-13.97,-2.54) 34(-13.97,2.54) 35(-11.43,-2.54) 36(-11.43,2.54) 37(-8.89,-2.54) 38(-8.89,2.54) 39(-6.35,-2.54) 40(-6.35,2.54) 41(-3.81,-2.54) 42(-3.81,2.54) 43(-1.27,-2.54) 44(-1.27,2.54) 45(1.27,-2.54) 46(1.27,2.54) 47(3.81,-2.54) 48(3.81,2.54) 49(6.35,-2.54) 50(6.35,2.54) 51(8.89,-2.54) 52(8.89,2.54) 53(11.43,-2.54) 54(11.43,2.54) 55(13.97,-2.54) 56(13.97,2.54) 57(16.51,-2.54) 58(16.51,2.54) 59(19.05,-2.54) 60(19.05,2.54) 61(21.59,-2.54) 62(21.59,2.54) 63(24.13,-2.54) 64(24.13,2.54) 65(26.67,-2.54) 66(26.67,2.54) 67(29.21,-2.54) 68(29.21,2.54) 69(31.75,-2.54) 70(31.75,2.54) 71(34.29,-2.54) 72(34.29,2.54) 73(36.83,-2.54) 74(36.83,2.54) 75(39.37,-2.54) 76(39.37,2.54) 77(41.91,-2.54) 78(41.91,2.54) 79(44.45,-2.54) 80(44.45,2.54) 81(46.99,-2.54) 82(46.99,2.54) 83(49.53,-2.54) 84(49.53,2.54) 85(52.07,-2.54) 86(52.07,2.54) 87(54.61,-2.54) 88(54.61,2.54)
Top Overlay:
  lines w0.203: -56.009,-3.695 56.009,-3.695 56.009,3.695 -56.009,3.695 -56.009,-3.695
  text "1" at -55.118,-5.588 h1.42
  text "2" at -55.118,4.064 h1.42
Mechanical 16:
  drawing of 352 lines, arcs and shapes, not listed